# Altium footprint library SMDLibrary.PcbLib: 306 footprints (part 12 of 20) (continued)
## LQFP208_FPT-208P-M06 [mm] (continued)
Top Overlay:
  circle w0.254: c0,0 r2
  circle w0.254: c-14,14 r0.3
  lines w0.254: -15.25,-15.25 -15.25,15.25 15.25,15.25 15.25,-15.25 -15.25,-15.25
3D body "LQFP208_FPT-208P-M06.stp": height 1.7, standoff 0, extent -15,-15 15,15

## LQFP_48 [mil]
pads (48):
  rect 58x9 smd paste+0 mask+0: 1(-166,108.27) 2(-166,88.58) 3(-166,68.9) 4(-166,49.21) 5(-166,29.53) 6(-166,9.84) 7(-166,-9.84) 8(-166,-29.53) 9(-166,-49.21) 10(-166,-68.9) 11(-166,-88.58) 12(-166,-108.27) 25(166,-108.27) 26(166,-88.58) 27(166,-68.9) 28(166,-49.21) 29(166,-29.53) 30(166,-9.84) 31(166,9.84) 32(166,29.53) 33(166,49.21) 34(166,68.9) 35(166,88.58) 36(166,108.27)
  rect 9x58 smd paste+0 mask+0: 13(-108.27,-166) 14(-88.58,-166) 15(-68.9,-166) 16(-49.21,-166) 17(-29.53,-166) 18(-9.84,-166) 19(9.84,-166) 20(29.53,-166) 21(49.21,-166) 22(68.9,-166) 23(88.58,-166) 24(108.27,-166) 37(108.27,166) 38(88.58,166) 39(68.9,166) 40(49.21,166) 41(29.53,166) 42(9.84,166) 43(-9.84,166) 44(-29.53,166) 45(-49.21,166) 46(-68.9,166) 47(-88.58,166) 48(-108.27,166)
Top Overlay:
  region: 56.71,205 41.71,205 41.71,215 56.71,215
  region: 205,-2.34 215,-2.34 215,-17.34 205,-17.34
  region: 37.03,-205 22.03,-205 22.03,-215 37.03,-215
  region: -205,-61.4 -215,-61.4 -215,-76.4 -205,-76.4
  lines w6: -147,-125.87 -147,-147 -125.87,-147 ; -147,125.87 -147,147 -125.87,147 ; 125.87,-147 147,-147 147,-125.87 ; 125.87,147 147,147 147,125.87
  text "*" at -232.5,108.11 h50
Mechanical 7:
  lines w1: -296,-142 -108.27,-142 ; -296,142 -108.27,142 ; -181,108.27 -181,371 ; -142,-296 -142,-108.27 ; 101,281 151,281 ; 108.27,-181 371,-181 ; 108.27,181 371,181 ; 142,-296 142,-108.27 ; 151,108.27 151,296 ; 166,88.58 296,88.58 ; 166,108.27 296,108.27 ; 181,296 181,108.27 181,371 ; 231,281 181,281 ; 281,38.58 281,88.58 ; 281,158.27 281,108.27 ; -281,-142 -276,-132 -286,-132 -281,-142 ; -281,-142 -281,142 ; -281,142 -276,132 -286,132 -281,142 ; -181,356 -171,351 -171,361 -181,356 ; -181,356 181,356 ; -142,-281 -132,-286 -132,-276 -142,-281 ; -142,-281 142,-281 ; 142,-281 132,-286 132,-276 142,-281 ; 151,281 141,276 141,286 151,281 ; 181,281 191,276 191,286 181,281 ; 181,356 171,351 171,361 181,356 ; 281,88.58 286,78.58 276,78.58 281,88.58 ; 281,108.27 286,118.27 276,118.27 281,108.27 ; 356,-181 361,-171 351,-171 356,-181 ; 356,-181 356,181 ; 356,181 361,171 351,171 356,181
  text "0.362in/9.195mm" at 376,-12.5 h25
  text "0.284in/7.214mm" at -488.5,-12.5 h25
  text "0.284in/7.214mm" at -93.75,-326 h25
  text "0.362in/9.195mm" at -93.75,376 h25
  text "0.03in/0.762mm" at 78.5,301 h25
  text "0.02in/0.5mm" at 301,85.93 h25
  text "Alt 2 Padstyle: OX90Y60D30P" at -337.5,-731 h50
  text "Alt 1 Padstyle: OX60Y90D30P" at -337.5,-671 h50
  text "Default Vert Padstyle: RX9Y58D0T" at -400,-491 h50
  text "Default Horiz Padstyle: RX9Y58D0T" at -412.5,-431 h50
Mechanical 13:
  drawing of 197 lines, arcs and shapes, not listed
  text "*" at -139.5,93.11 h50
Mechanical 15:
  region: -122.77,-152 -152,-152 -152,-122.77 -205,-122.77 -205,122.77 -152,122.77 -152,152 -122.77,152 -122.77,205 122.77,205 122.77,152 152,152 152,122.77 205,122.77 205,-122.77 152,-122.77 152,-152 122.77,-152 122.77,-205 -122.77,-205
  lines w6: -205,-122.77 -205,122.77 -152,122.77 -152,152 -122.77,152 -122.77,205 122.77,205 122.77,152 152,152 152,122.77 205,122.77 205,-122.77 152,-122.77 152,-152 122.77,-152 122.77,-205 -122.77,-205 -122.77,-152 -152,-152 -152,-122.77 -205,-122.77
3D body "LQFP-48.step": height 63.11, standoff 0, extent -180.98,-180.98 180.99,180.99
3D body: height 10, standoff 0, extent 0,0 10,10

## LQFP_48_L [mil]
pads (48):
  rect 46x7 smd paste+0 mask+0: 1(-164,108.27) 2(-164,88.58) 3(-164,68.9) 4(-164,49.21) 5(-164,29.53) 6(-164,9.84) 7(-164,-9.84) 8(-164,-29.53) 9(-164,-49.21) 10(-164,-68.9) 11(-164,-88.58) 12(-164,-108.27) 25(164,-108.27) 26(164,-88.58) 27(164,-68.9) 28(164,-49.21) 29(164,-29.53) 30(164,-9.84) 31(164,9.84) 32(164,29.53) 33(164,49.21) 34(164,68.9) 35(164,88.58) 36(164,108.27)
  rect 7x46 smd paste+0 mask+0: 13(-108.27,-164) 14(-88.58,-164) 15(-68.9,-164) 16(-49.21,-164) 17(-29.53,-164) 18(-9.84,-164) 19(9.84,-164) 20(29.53,-164) 21(49.21,-164) 22(68.9,-164) 23(88.58,-164) 24(108.27,-164) 37(108.27,164) 38(88.58,164) 39(68.9,164) 40(49.21,164) 41(29.53,164) 42(9.84,164) 43(-9.84,164) 44(-29.53,164) 45(-49.21,164) 46(-68.9,164) 47(-88.58,164) 48(-108.27,164)
Top Overlay:
  region: -197,-61.4 -207,-61.4 -207,-76.4 -197,-76.4
  region: 37.03,-197 22.03,-197 22.03,-207 37.03,-207
  region: 197,-2.34 207,-2.34 207,-17.34 197,-17.34
  region: 56.71,197 41.71,197 41.71,207 56.71,207
  lines w6: -147,-124.87 -147,-147 -124.87,-147 ; -147,124.87 -147,147 -124.87,147 ; 124.87,-147 147,-147 147,-124.87 ; 124.87,147 147,147 147,124.87
  text "*" at -224.5,108.11 h50
Mechanical 7:
  lines w1: -294,-142 -108.27,-142 ; -294,142 -108.27,142 ; -181,108.27 -181,369 ; -142,-294 -142,-108.27 ; 101,279 151,279 ; 108.27,-181 369,-181 ; 108.27,181 369,181 ; 142,-294 142,-108.27 ; 151,108.27 151,294 ; 164,88.58 294,88.58 ; 164,108.27 294,108.27 ; 181,294 181,108.27 181,369 ; 231,279 181,279 ; 279,38.58 279,88.58 ; 279,158.27 279,108.27 ; -279,-142 -279,142 ; -279,-142 -284,-132 -274,-132 -279,-142 ; -279,142 -284,132 -274,132 -279,142 ; -181,354 181,354 ; -181,354 -171,359 -171,349 -181,354 ; -142,-279 142,-279 ; -142,-279 -132,-274 -132,-284 -142,-279 ; 142,-279 132,-274 132,-284 142,-279 ; 151,279 141,284 141,274 151,279 ; 181,279 191,284 191,274 181,279 ; 181,354 171,359 171,349 181,354 ; 279,88.58 274,78.58 284,78.58 279,88.58 ; 279,108.27 274,118.27 284,118.27 279,108.27 ; 354,-181 354,181 ; 354,-181 349,-171 359,-171 354,-181 ; 354,181 349,171 359,171 354,181
  text "Default Horiz Padstyle: RX7Y46D0T" at -412.5,-429 h50
  text "Default Vert Padstyle: RX7Y46D0T" at -400,-489 h50
  text "Alt 1 Padstyle: OX60Y90D30P" at -337.5,-669 h50
  text "Alt 2 Padstyle: OX90Y60D30P" at -337.5,-729 h50
  text "0.02in/0.5mm" at 299,85.93 h25
  text "0.03in/0.762mm" at 78.5,299 h25
  text "0.362in/9.195mm" at -93.75,374 h25
  text "0.284in/7.214mm" at -93.75,-324 h25
  text "0.284in/7.214mm" at -486.5,-12.5 h25
  text "0.362in/9.195mm" at 374,-12.5 h25
Mechanical 13:
  drawing of 197 lines, arcs and shapes, not listed
  text "*" at -139.5,93.11 h50
Mechanical 15:
  region: -115.77,-146 -146,-146 -146,-115.77 -191,-115.77 -191,115.77 -146,115.77 -146,146 -115.77,146 -115.77,191 115.77,191 115.77,146 146,146 146,115.77 191,115.77 191,-115.77 146,-115.77 146,-146 115.77,-146 115.77,-191 -115.77,-191
  lines w6: -191,-115.77 -146,-115.77 -146,-146 -115.77,-146 -115.77,-191 115.77,-191 115.77,-146 146,-146 146,-115.77 191,-115.77 191,115.77 146,115.77 146,146 115.77,146 115.77,191 -115.77,191 -115.77,146 -146,146 -146,115.77 -191,115.77 -191,-115.77
3D body "LQFP-48-L.step": height 63.11, standoff 0, extent -180.98,-180.98 180.99,180.99
3D body: height 10, standoff 0, extent 0,0 10,10

## LQFP_48_M [mil]
pads (48):
  rect 70x11 smd paste+0 mask+0: 1(-168,108.27) 2(-168,88.58) 3(-168,68.9) 4(-168,49.21) 5(-168,29.53) 6(-168,9.84) 7(-168,-9.84) 8(-168,-29.53) 9(-168,-49.21) 10(-168,-68.9) 11(-168,-88.58) 12(-168,-108.27) 25(168,-108.27) 26(168,-88.58) 27(168,-68.9) 28(168,-49.21) 29(168,-29.53) 30(168,-9.84) 31(168,9.84) 32(168,29.53) 33(168,49.21) 34(168,68.9) 35(168,88.58) 36(168,108.27)
  rect 11x70 smd paste+0 mask+0: 13(-108.27,-168) 14(-88.58,-168) 15(-68.9,-168) 16(-49.21,-168) 17(-29.53,-168) 18(-9.84,-168) 19(9.84,-168) 20(29.53,-168) 21(49.21,-168) 22(68.9,-168) 23(88.58,-168) 24(108.27,-168) 37(108.27,168) 38(88.58,168) 39(68.9,168) 40(49.21,168) 41(29.53,168) 42(9.84,168) 43(-9.84,168) 44(-29.53,168) 45(-49.21,168) 46(-68.9,168) 47(-88.58,168) 48(-108.27,168)
Top Overlay:
  region: 56.71,213 41.71,213 41.71,223 56.71,223
  region: 213,-2.34 223,-2.34 223,-17.34 213,-17.34
  region: 37.03,-213 22.03,-213 22.03,-223 37.03,-223
  region: -213,-61.4 -223,-61.4 -223,-76.4 -213,-76.4
  lines w6: -147,-126.87 -147,-147 -126.87,-147 ; -147,126.87 -147,147 -126.87,147 ; 126.87,-147 147,-147 147,-126.87 ; 126.87,147 147,147 147,126.87
  text "*" at -240.5,108.11 h50
Mechanical 7:
  lines w1: -298,-142 -108.27,-142 ; -298,142 -108.27,142 ; -181,108.27 -181,373 ; -142,-298 -142,-108.27 ; 101,283 151,283 ; 108.27,-181 373,-181 ; 108.27,181 373,181 ; 142,-298 142,-108.27 ; 151,108.27 151,298 ; 168,88.58 298,88.58 ; 168,108.27 298,108.27 ; 181,298 181,108.27 181,373 ; 231,283 181,283 ; 283,38.58 283,88.58 ; 283,158.27 283,108.27 ; -283,-142 -278,-132 -288,-132 -283,-142 ; -283,-142 -283,142 ; -283,142 -278,132 -288,132 -283,142 ; -181,358 -171,353 -171,363 -181,358 ; -181,358 181,358 ; -142,-283 -132,-288 -132,-278 -142,-283 ; -142,-283 142,-283 ; 142,-283 132,-288 132,-278 142,-283 ; 151,283 141,278 141,288 151,283 ; 181,283 191,278 191,288 181,283 ; 181,358 171,353 171,363 181,358 ; 283,88.58 288,78.58 278,78.58 283,88.58 ; 283,108.27 288,118.27 278,118.27 283,108.27 ; 358,-181 363,-171 353,-171 358,-181 ; 358,-181 358,181 ; 358,181 363,171 353,171 358,181
  text "0.362in/9.195mm" at 378,-12.5 h25
  text "0.284in/7.214mm" at -490.5,-12.5 h25
  text "0.284in/7.214mm" at -93.75,-328 h25
  text "0.362in/9.195mm" at -93.75,378 h25
  text "0.03in/0.762mm" at 78.5,303 h25
  text "0.02in/0.5mm" at 303,85.93 h25
  text "Alt 2 Padstyle: OX90Y60D30P" at -337.5,-733 h50
  text "Alt 1 Padstyle: OX60Y90D30P" at -337.5,-673 h50
  text "Default Vert Padstyle: RX11Y70D0T" at -412.5,-493 h50
  text "Default Horiz Padstyle: RX11Y70D0T" at -425,-433 h50
Mechanical 13:
  drawing of 197 lines, arcs and shapes, not listed
  text "*" at -139.5,93.11 h50
Mechanical 15:
  region: -133.77,-162 -162,-162 -162,-133.77 -223,-133.77 -223,133.77 -162,133.77 -162,162 -133.77,162 -133.77,223 133.77,223 133.77,162 162,162 162,133.77 223,133.77 223,-133.77 162,-133.77 162,-162 133.77,-162 133.77,-223 -133.77,-223
  lines w6: -223,-133.77 -223,133.77 -162,133.77 -162,162 -133.77,162 -133.77,223 133.77,223 133.77,162 162,162 162,133.77 223,133.77 223,-133.77 162,-133.77 162,-162 133.77,-162 133.77,-223 -133.77,-223 -133.77,-162 -162,-162 -162,-133.77 -223,-133.77
3D body: height 10, standoff 0, extent 0,0 10,10
3D body "LQFP-48-M.step": height 63.11, standoff 0, extent -180.98,-180.98 180.99,180.99

## LQFP_64 [mil]
pads (64):
  rect 58x9 smd paste+0 mask+0: 1(-221.5,147.64) 2(-221.5,127.95) 3(-221.5,108.27) 4(-221.5,88.58) 5(-221.5,68.9) 6(-221.5,49.21) 7(-221.5,29.53) 8(-221.5,9.84) 9(-221.5,-9.84) 10(-221.5,-29.53) 11(-221.5,-49.21) 12(-221.5,-68.9) 13(-221.5,-88.58) 14(-221.5,-108.27) 15(-221.5,-127.95) 16(-221.5,-147.64) 33(221.5,-147.64) 34(221.5,-127.95) 35(221.5,-108.27) 36(221.5,-88.58) 37(221.5,-68.9) 38(221.5,-49.21) 39(221.5,-29.53) 40(221.5,-9.84) 41(221.5,9.84) 42(221.5,29.53) 43(221.5,49.21) 44(221.5,68.9) 45(221.5,88.58) 46(221.5,108.27) 47(221.5,127.95) 48(221.5,147.64)
  rect 9x58 smd paste+0 mask+0: 17(-147.64,-221.5) 18(-127.95,-221.5) 19(-108.27,-221.5) 20(-88.58,-221.5) 21(-68.9,-221.5) 22(-49.21,-221.5) 23(-29.53,-221.5) 24(-9.84,-221.5) 25(9.84,-221.5) 26(29.53,-221.5) 27(49.21,-221.5) 28(68.9,-221.5) 29(88.58,-221.5) 30(108.27,-221.5) 31(127.95,-221.5) 32(147.64,-221.5) 49(147.64,221.5) 50(127.95,221.5) 51(108.27,221.5) 52(88.58,221.5) 53(68.9,221.5) 54(49.21,221.5) 55(29.53,221.5) 56(9.84,221.5) 57(-9.84,221.5) 58(-29.53,221.5) 59(-49.21,221.5) 60(-68.9,221.5) 61(-88.58,221.5) 62(-108.27,221.5) 63(-127.95,221.5) 64(-147.64,221.5)
Top Overlay:
  region: -260.5,-22.03 -270.5,-22.03 -270.5,-37.03 -260.5,-37.03
  region: -81.08,-260.5 -96.08,-260.5 -96.08,-270.5 -81.08,-270.5
  region: 115.77,-260.5 100.77,-260.5 100.77,-270.5 115.77,-270.5
  region: 260.5,-2.34 270.5,-2.34 270.5,-17.34 260.5,-17.34
  region: 135.45,260.5 120.45,260.5 120.45,270.5 135.45,270.5
  region: -61.4,260.5 -76.4,260.5 -76.4,270.5 -61.4,270.5
  lines w6: -204,-165.24 -204,-204 -165.24,-204 ; -204,165.24 -204,204 -165.24,204 ; 165.24,-204 204,-204 204,-165.24 ; 165.24,204 204,204 204,165.24
  text "*" at -288,147.48 h50
Mechanical 7:
  lines w1: -351.5,-199 -147.64,-199 ; -351.5,199 -147.64,199 ; -236.5,147.64 -236.5,426.5 ; -199,-351.5 -199,-147.64 ; 147.64,-236.5 426.5,-236.5 ; 147.64,236.5 426.5,236.5 ; 156.5,336.5 206.5,336.5 ; 199,-351.5 199,-147.64 ; 206.5,147.64 206.5,351.5 ; 221.5,127.95 351.5,127.95 ; 221.5,147.64 351.5,147.64 ; 236.5,351.5 236.5,147.64 236.5,426.5 ; 286.5,336.5 236.5,336.5 ; 336.5,77.95 336.5,127.95 ; 336.5,197.64 336.5,147.64 ; -336.5,-199 -336.5,199 ; -336.5,-199 -341.5,-189 -331.5,-189 -336.5,-199 ; -336.5,199 -341.5,189 -331.5,189 -336.5,199 ; -236.5,411.5 236.5,411.5 ; -236.5,411.5 -226.5,416.5 -226.5,406.5 -236.5,411.5 ; -199,-336.5 199,-336.5 ; -199,-336.5 -189,-331.5 -189,-341.5 -199,-336.5 ; 199,-336.5 189,-331.5 189,-341.5 199,-336.5 ; 206.5,336.5 196.5,341.5 196.5,331.5 206.5,336.5 ; 236.5,336.5 246.5,341.5 246.5,331.5 236.5,336.5 ; 236.5,411.5 226.5,416.5 226.5,406.5 236.5,411.5 ; 336.5,127.95 331.5,117.95 341.5,117.95 336.5,127.95 ; 336.5,147.64 331.5,157.64 341.5,157.64 336.5,147.64 ; 411.5,-236.5 411.5,236.5 ; 411.5,-236.5 406.5,-226.5 416.5,-226.5 411.5,-236.5 ; 411.5,236.5 406.5,226.5 416.5,226.5 411.5,236.5
  text "Default Horiz Padstyle: RX9Y58D0T" at -412.5,-486.5 h50
  text "Default Vert Padstyle: RX9Y58D0T" at -400,-546.5 h50
  text "Alt 1 Padstyle: OX60Y90D30P" at -337.5,-726.5 h50
  text "Alt 2 Padstyle: OX90Y60D30P" at -337.5,-786.5 h50
  text "0.02in/0.5mm" at 356.5,125.3 h25
  text "0.03in/0.762mm" at 134,356.5 h25
  text "0.473in/12.014mm" at -100,431.5 h25
  text "0.398in/10.109mm" at -100,-381.5 h25
  text "0.398in/10.109mm" at -556.5,-12.5 h25
  text "0.473in/12.014mm" at 431.5,-12.5 h25
Mechanical 13:
  drawing of 261 lines, arcs and shapes, not listed
  text "*" at -196.5,132.48 h50
Mechanical 15:
  region: -162.14,-209 -209,-209 -209,-162.14 -260.5,-162.14 -260.5,162.14 -209,162.14 -209,209 -162.14,209 -162.14,260.5 162.14,260.5 162.14,209 209,209 209,162.14 260.5,162.14 260.5,-162.14 209,-162.14 209,-209 162.14,-209 162.14,-260.5 -162.14,-260.5
  lines w6: -260.5,-162.14 -209,-162.14 -209,-209 -162.14,-209 -162.14,-260.5 162.14,-260.5 162.14,-209 209,-209 209,-162.14 260.5,-162.14 260.5,162.14 209,162.14 209,209 162.14,209 162.14,260.5 -162.14,260.5 -162.14,209 -209,209 -209,162.14 -260.5,162.14 -260.5,-162.14
3D body "LQFP-64.step": height 63.11, standoff 0, extent -236.49,-236.49 236.5,236.5
3D body: height 10, standoff 0, extent 0,0 10,10

## LQFP_64_L [mil]
pads (64):
  rect 46x7 smd paste+0 mask+0: 1(-219.5,147.64) 2(-219.5,127.95) 3(-219.5,108.27) 4(-219.5,88.58) 5(-219.5,68.9) 6(-219.5,49.21) 7(-219.5,29.53) 8(-219.5,9.84) 9(-219.5,-9.84) 10(-219.5,-29.53) 11(-219.5,-49.21) 12(-219.5,-68.9) 13(-219.5,-88.58) 14(-219.5,-108.27) 15(-219.5,-127.95) 16(-219.5,-147.64) 33(219.5,-147.64) 34(219.5,-127.95) 35(219.5,-108.27) 36(219.5,-88.58) 37(219.5,-68.9) 38(219.5,-49.21) 39(219.5,-29.53) 40(219.5,-9.84) 41(219.5,9.84) 42(219.5,29.53) 43(219.5,49.21) 44(219.5,68.9) 45(219.5,88.58) 46(219.5,108.27) 47(219.5,127.95) 48(219.5,147.64)
  rect 7x46 smd paste+0 mask+0: 17(-147.64,-219.5) 18(-127.95,-219.5) 19(-108.27,-219.5) 20(-88.58,-219.5) 21(-68.9,-219.5) 22(-49.21,-219.5) 23(-29.53,-219.5) 24(-9.84,-219.5) 25(9.84,-219.5) 26(29.53,-219.5) 27(49.21,-219.5) 28(68.9,-219.5) 29(88.58,-219.5) 30(108.27,-219.5) 31(127.95,-219.5) 32(147.64,-219.5) 49(147.64,219.5) 50(127.95,219.5) 51(108.27,219.5) 52(88.58,219.5) 53(68.9,219.5) 54(49.21,219.5) 55(29.53,219.5) 56(9.84,219.5) 57(-9.84,219.5) 58(-29.53,219.5) 59(-49.21,219.5) 60(-68.9,219.5) 61(-88.58,219.5) 62(-108.27,219.5) 63(-127.95,219.5) 64(-147.64,219.5)
Top Overlay:
  region: -252.5,-22.03 -262.5,-22.03 -262.5,-37.03 -252.5,-37.03
  region: -81.08,-252.5 -96.08,-252.5 -96.08,-262.5 -81.08,-262.5
  region: 115.77,-252.5 100.77,-252.5 100.77,-262.5 115.77,-262.5
  region: 252.5,-2.34 262.5,-2.34 262.5,-17.34 252.5,-17.34
  region: 135.45,252.5 120.45,252.5 120.45,262.5 135.45,262.5
  region: -61.4,252.5 -76.4,252.5 -76.4,262.5 -61.4,262.5
  lines w6: -204,-164.24 -204,-204 -164.24,-204 ; -204,164.24 -204,204 -164.24,204 ; 164.24,-204 204,-204 204,-164.24 ; 164.24,204 204,204 204,164.24
  text "*" at -280,147.48 h50
Mechanical 7:
  lines w1: -349.5,-199 -147.64,-199 ; -349.5,199 -147.64,199 ; -236.5,147.64 -236.5,424.5 ; -199,-349.5 -199,-147.64 ; 147.64,-236.5 424.5,-236.5 ; 147.64,236.5 424.5,236.5 ; 156.5,334.5 206.5,334.5 ; 199,-349.5 199,-147.64 ; 206.5,147.64 206.5,349.5 ; 219.5,127.95 349.5,127.95 ; 219.5,147.64 349.5,147.64 ; 236.5,349.5 236.5,147.64 236.5,424.5 ; 286.5,334.5 236.5,334.5 ; 334.5,77.95 334.5,127.95 ; 334.5,197.64 334.5,147.64 ; -334.5,-199 -334.5,199 ; -334.5,-199 -339.5,-189 -329.5,-189 -334.5,-199 ; -334.5,199 -339.5,189 -329.5,189 -334.5,199 ; -236.5,409.5 236.5,409.5 ; -236.5,409.5 -226.5,414.5 -226.5,404.5 -236.5,409.5 ; -199,-334.5 199,-334.5 ; -199,-334.5 -189,-329.5 -189,-339.5 -199,-334.5 ; 199,-334.5 189,-329.5 189,-339.5 199,-334.5 ; 206.5,334.5 196.5,339.5 196.5,329.5 206.5,334.5 ; 236.5,334.5 246.5,339.5 246.5,329.5 236.5,334.5 ; 236.5,409.5 226.5,414.5 226.5,404.5 236.5,409.5 ; 334.5,127.95 329.5,117.95 339.5,117.95 334.5,127.95 ; 334.5,147.64 329.5,157.64 339.5,157.64 334.5,147.64 ; 409.5,-236.5 409.5,236.5 ; 409.5,-236.5 404.5,-226.5 414.5,-226.5 409.5,-236.5 ; 409.5,236.5 404.5,226.5 414.5,226.5 409.5,236.5
  text "Default Horiz Padstyle: RX7Y46D0T" at -412.5,-484.5 h50
  text "Default Vert Padstyle: RX7Y46D0T" at -400,-544.5 h50
  text "Alt 1 Padstyle: OX60Y90D30P" at -337.5,-724.5 h50
  text "Alt 2 Padstyle: OX90Y60D30P" at -337.5,-784.5 h50
  text "0.02in/0.5mm" at 354.5,125.3 h25
  text "0.03in/0.762mm" at 134,354.5 h25
  text "0.473in/12.014mm" at -100,429.5 h25
  text "0.398in/10.109mm" at -100,-379.5 h25
  text "0.398in/10.109mm" at -554.5,-12.5 h25
  text "0.473in/12.014mm" at 429.5,-12.5 h25
Mechanical 13:
  drawing of 261 lines, arcs and shapes, not listed
  text "*" at -196.5,132.48 h50
Mechanical 15:
  region: -155.14,-203 -203,-203 -203,-155.14 -246.5,-155.14 -246.5,155.14 -203,155.14 -203,203 -155.14,203 -155.14,246.5 155.14,246.5 155.14,203 203,203 203,155.14 246.5,155.14 246.5,-155.14 203,-155.14 203,-203 155.14,-203 155.14,-246.5 -155.14,-246.5
  lines w6: -246.5,-155.14 -203,-155.14 -203,-203 -155.14,-203 -155.14,-246.5 155.14,-246.5 155.14,-203 203,-203 203,-155.14 246.5,-155.14 246.5,155.14 203,155.14 203,203 155.14,203 155.14,246.5 -155.14,246.5 -155.14,203 -203,203 -203,155.14 -246.5,155.14 -246.5,-155.14
3D body "LQFP-64-L.step": height 63.11, standoff 0, extent -236.49,-236.49 236.5,236.5
3D body: height 10, standoff 0, extent 0,0 10,10

## LQFP_64_M [mil]
pads (64):
  rect 70x11 smd paste+0 mask+0: 1(-223.5,147.64) 2(-223.5,127.95) 3(-223.5,108.27) 4(-223.5,88.58) 5(-223.5,68.9) 6(-223.5,49.21) 7(-223.5,29.53) 8(-223.5,9.84) 9(-223.5,-9.84) 10(-223.5,-29.53) 11(-223.5,-49.21) 12(-223.5,-68.9) 13(-223.5,-88.58) 14(-223.5,-108.27) 15(-223.5,-127.95) 16(-223.5,-147.64) 33(223.5,-147.64) 34(223.5,-127.95) 35(223.5,-108.27) 36(223.5,-88.58) 37(223.5,-68.9) 38(223.5,-49.21) 39(223.5,-29.53) 40(223.5,-9.84) 41(223.5,9.84) 42(223.5,29.53) 43(223.5,49.21) 44(223.5,68.9) 45(223.5,88.58) 46(223.5,108.27) 47(223.5,127.95) 48(223.5,147.64)
  rect 11x70 smd paste+0 mask+0: 17(-147.64,-223.5) 18(-127.95,-223.5) 19(-108.27,-223.5) 20(-88.58,-223.5) 21(-68.9,-223.5) 22(-49.21,-223.5) 23(-29.53,-223.5) 24(-9.84,-223.5) 25(9.84,-223.5) 26(29.53,-223.5) 27(49.21,-223.5) 28(68.9,-223.5) 29(88.58,-223.5) 30(108.27,-223.5) 31(127.95,-223.5) 32(147.64,-223.5) 49(147.64,223.5) 50(127.95,223.5) 51(108.27,223.5) 52(88.58,223.5) 53(68.9,223.5) 54(49.21,223.5) 55(29.53,223.5) 56(9.84,223.5) 57(-9.84,223.5) 58(-29.53,223.5) 59(-49.21,223.5) 60(-68.9,223.5) 61(-88.58,223.5) 62(-108.27,223.5) 63(-127.95,223.5) 64(-147.64,223.5)
Top Overlay:
  region: -61.4,268.5 -76.4,268.5 -76.4,278.5 -61.4,278.5
  region: 135.45,268.5 120.45,268.5 120.45,278.5 135.45,278.5
  region: 268.5,-2.34 278.5,-2.34 278.5,-17.34 268.5,-17.34
  region: 115.77,-268.5 100.77,-268.5 100.77,-278.5 115.77,-278.5
  region: -81.08,-268.5 -96.08,-268.5 -96.08,-278.5 -81.08,-278.5
  region: -268.5,-22.03 -278.5,-22.03 -278.5,-37.03 -268.5,-37.03
  lines w6: -204,-166.24 -204,-204 -166.24,-204 ; -204,166.24 -204,204 -166.24,204 ; 166.24,-204 204,-204 204,-166.24 ; 166.24,204 204,204 204,166.24
  text "*" at -296,147.48 h50
Mechanical 7:
  lines w1: -353.5,-199 -147.64,-199 ; -353.5,199 -147.64,199 ; -236.5,147.64 -236.5,428.5 ; -199,-353.5 -199,-147.64 ; 147.64,-236.5 428.5,-236.5 ; 147.64,236.5 428.5,236.5 ; 156.5,338.5 206.5,338.5 ; 199,-353.5 199,-147.64 ; 206.5,147.64 206.5,353.5 ; 223.5,127.95 353.5,127.95 ; 223.5,147.64 353.5,147.64 ; 236.5,353.5 236.5,147.64 236.5,428.5 ; 286.5,338.5 236.5,338.5 ; 338.5,77.95 338.5,127.95 ; 338.5,197.64 338.5,147.64 ; -338.5,-199 -333.5,-189 -343.5,-189 -338.5,-199 ; -338.5,-199 -338.5,199 ; -338.5,199 -333.5,189 -343.5,189 -338.5,199 ; -236.5,413.5 -226.5,408.5 -226.5,418.5 -236.5,413.5 ; -236.5,413.5 236.5,413.5 ; -199,-338.5 -189,-343.5 -189,-333.5 -199,-338.5 ; -199,-338.5 199,-338.5 ; 199,-338.5 189,-343.5 189,-333.5 199,-338.5 ; 206.5,338.5 196.5,333.5 196.5,343.5 206.5,338.5 ; 236.5,338.5 246.5,333.5 246.5,343.5 236.5,338.5 ; 236.5,413.5 226.5,408.5 226.5,418.5 236.5,413.5 ; 338.5,127.95 343.5,117.95 333.5,117.95 338.5,127.95 ; 338.5,147.64 343.5,157.64 333.5,157.64 338.5,147.64 ; 413.5,-236.5 418.5,-226.5 408.5,-226.5 413.5,-236.5 ; 413.5,-236.5 413.5,236.5 ; 413.5,236.5 418.5,226.5 408.5,226.5 413.5,236.5
  text "0.473in/12.014mm" at 433.5,-12.5 h25
  text "0.398in/10.109mm" at -558.5,-12.5 h25
  text "0.398in/10.109mm" at -100,-383.5 h25
  text "0.473in/12.014mm" at -100,433.5 h25
  text "0.03in/0.762mm" at 134,358.5 h25
  text "0.02in/0.5mm" at 358.5,125.3 h25
  text "Alt 2 Padstyle: OX90Y60D30P" at -337.5,-788.5 h50
  text "Alt 1 Padstyle: OX60Y90D30P" at -337.5,-728.5 h50
  text "Default Vert Padstyle: RX11Y70D0T" at -412.5,-548.5 h50
  text "Default Horiz Padstyle: RX11Y70D0T" at -425,-488.5 h50
Mechanical 13:
  drawing of 261 lines, arcs and shapes, not listed
  text "*" at -196.5,132.48 h50
Mechanical 15:
  region: -173.14,-219 -219,-219 -219,-173.14 -278.5,-173.14 -278.5,173.14 -219,173.14 -219,219 -173.14,219 -173.14,278.5 173.14,278.5 173.14,219 219,219 219,173.14 278.5,173.14 278.5,-173.14 219,-173.14 219,-219 173.14,-219 173.14,-278.5 -173.14,-278.5
  lines w6: -278.5,-173.14 -278.5,173.14 -219,173.14 -219,219 -173.14,219 -173.14,278.5 173.14,278.5 173.14,219 219,219 219,173.14 278.5,173.14 278.5,-173.14 219,-173.14 219,-219 173.14,-219 173.14,-278.5 -173.14,-278.5 -173.14,-219 -219,-219 -219,-173.14 -278.5,-173.14
3D body "LQFP-64-M.step": height 63.11, standoff 0, extent -236.49,-236.49 236.5,236.5
3D body: height 10, standoff 0, extent 0,0 10,10